# Altium footprint library NASCO 3D PCBLIB.PcbLib: 108 footprints (part 2 of 7)
Each footprint in its own frame and in the unit in brackets; x right, y up, seen from the top. Pads: shape width x height; smd on the part's side, far side on the other; paste and mask are expansions set on the pad; w line width, h text height; cw(c..) or ccw(c..) is an arc to the next point about the centre after c.
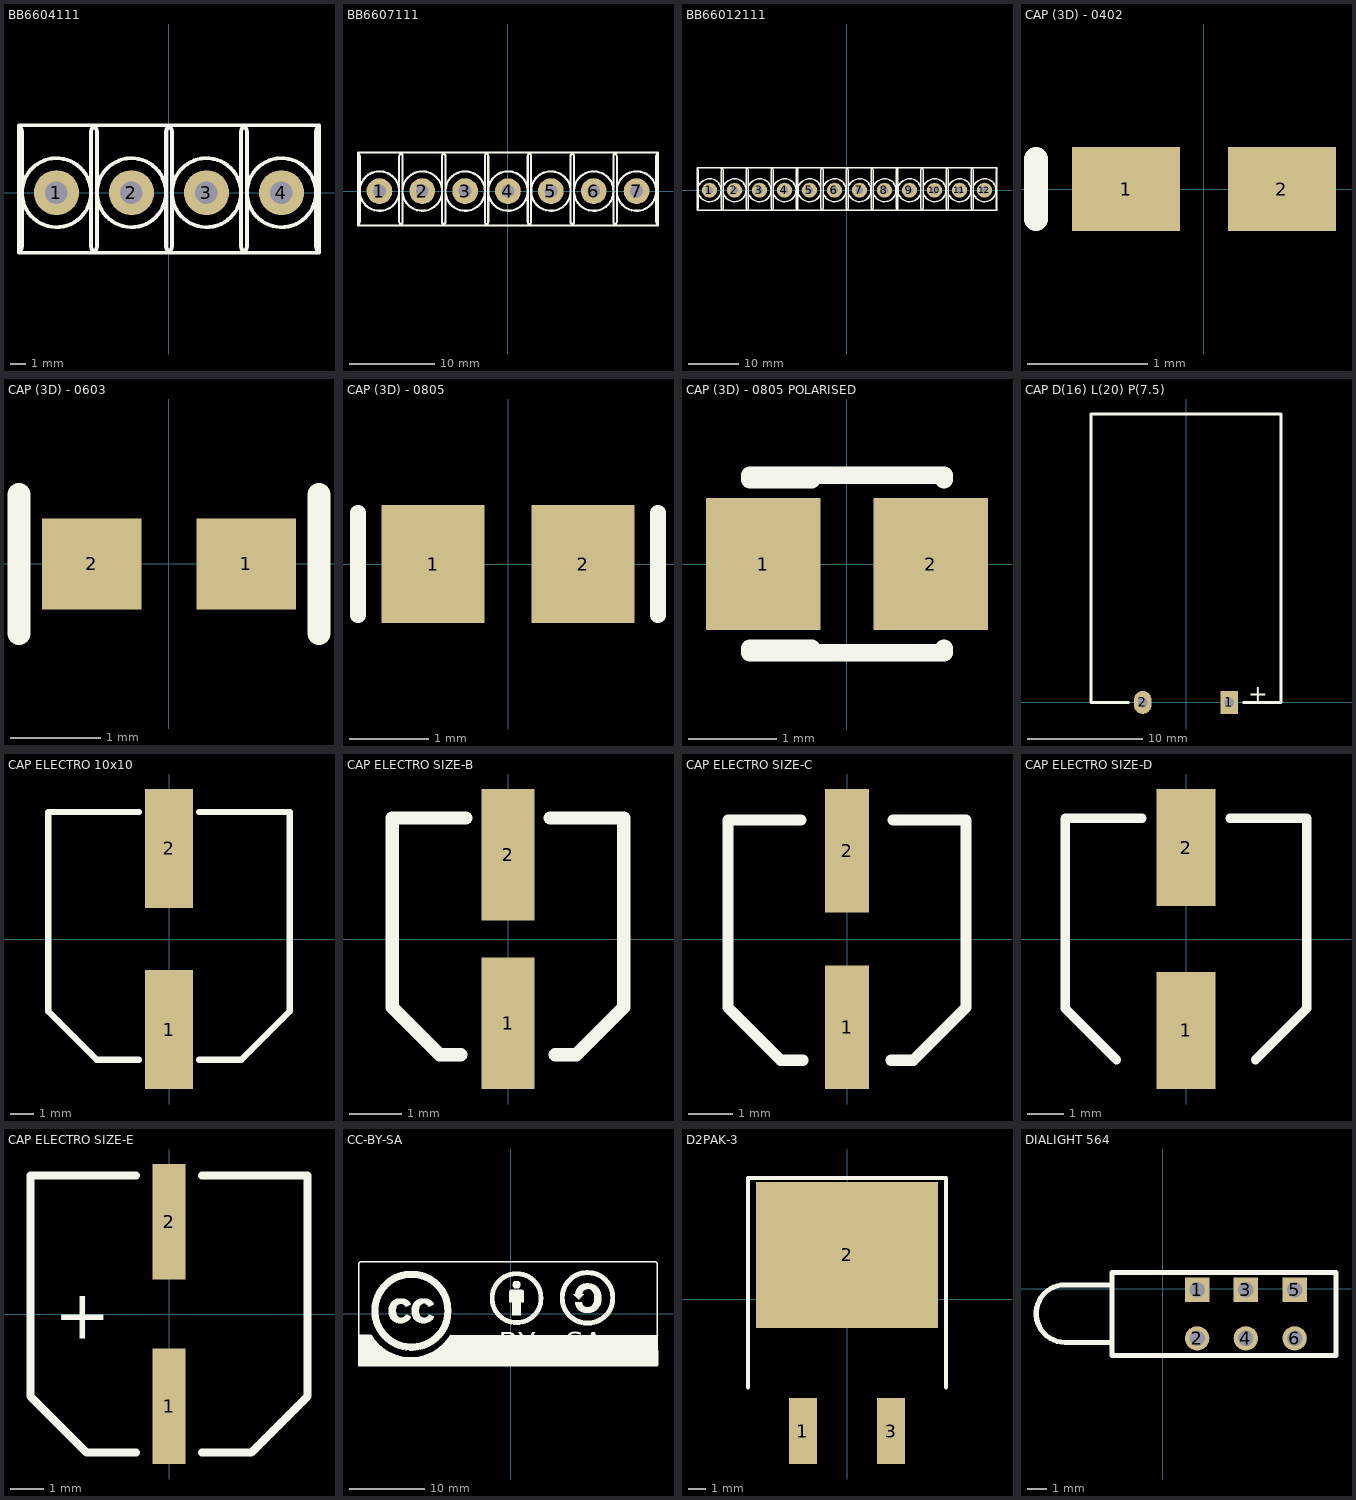
[diagram p1: the footprints below, top view; thin cyan lines are the x and y axes]

## BB6604111 [mm] "RAILTEC B 4 WAY"
pads (4):
  round 3 hole 1.5: 1(-7.5,0) 2(-2.5,0) 3(2.5,0) 4(7.5,0)
Top Overlay:
  circle w0.254: c-7.5,0 r2.3
  circle w0.254: c-2.5,0 r2.3
  circle w0.254: c2.5,0 r2.3
  circle w0.254: c7.5,0 r2.3
  lines w0.254: -9.827,-3.704 -10,-4.004 ; -9.827,4.196 -10,4.496 ; -9.8,-3.604 -9.8,4.096 ; -5.2,-3.604 -5.2,4.096 ; -5.173,-3.704 -5,-4.004 -4.827,-3.704 ; -5.173,4.196 -5,4.496 -4.827,4.196 ; -4.8,-3.604 -4.8,4.096 ; -0.2,-3.604 -0.2,4.096 ; -0.173,-3.704 0,-4.004 ; -0.173,4.196 0,4.496 ; 0.173,-3.704 0,-4.004 ; 0.173,4.196 0,4.496 ; 0.2,-3.604 0.2,4.096 ; 4.8,-3.604 4.8,4.096 ; 4.827,-3.704 5,-4.004 5.173,-3.704 ; 4.827,4.196 5,4.496 5.173,4.196 ; 5.2,-3.604 5.2,4.096 ; 9.8,-3.604 9.8,4.096 ; 9.827,-3.704 10,-4.004 ; 9.827,4.196 10,4.496 ; -10,-4.004 0,-4.004 ; -10,-4.004 -10,4.496 ; -10,-4.004 -10,4.496 ; -10,4.496 0,4.496 ; 0,-4.004 10,-4.004 ; 0,4.496 10,4.496 ; 10,-4.004 10,4.496 ; 10,4.496 10,4.496 ; 10,4.496 10,4.496
3D body "terminal_blocks_a-tb500-tk04sb.stp": height 14.02, standoff -4.68, extent -10,-3.809 10,4.496

## BB6607111 [mm] "RAILTEC B 7 WAY"
pads (7):
  round 3 hole 1.5: 1(-15,0) 2(-10,0) 3(-5,0) 4(0,0) 5(5,0) 6(10,0) 7(15,0)
Top Overlay:
  circle w0.254: c0,0 r2.3
  circle w0.254: c5,0 r2.3
  circle w0.254: c10,0 r2.3
  circle w0.254: c15,0 r2.3
  circle w0.254: c-15,0 r2.3
  circle w0.254: c-10,0 r2.3
  circle w0.254: c-5,0 r2.3
  circle w0.254: c0,0 r2.3
  lines w0.254: -17.327,-3.704 -17.5,-4.004 ; -17.327,4.196 -17.5,4.496 ; -17.3,-3.604 -17.3,4.096 ; -12.7,-3.604 -12.7,4.096 ; -12.673,-3.704 -12.5,-4.004 -12.327,-3.704 ; -12.673,4.196 -12.5,4.496 -12.327,4.196 ; -12.3,-3.604 -12.3,4.096 ; -7.7,-3.604 -7.7,4.096 ; -7.673,-3.704 -7.5,-4.004 ; -7.673,4.196 -7.5,4.496 ; -7.327,-3.704 -7.5,-4.004 ; -7.327,4.196 -7.5,4.496 ; -7.3,-3.604 -7.3,4.096 ; -2.7,-3.604 -2.7,4.096 ; -2.673,-3.704 -2.5,-4.004 ; -2.673,4.196 -2.5,4.496 ; 2.673,-3.704 2.5,-4.004 ; 2.673,4.196 2.5,4.496 ; 2.7,-3.604 2.7,4.096 ; 7.3,-3.604 7.3,4.096 ; 7.327,-3.704 7.5,-4.004 ; 7.327,4.196 7.5,4.496 ; 7.673,-3.704 7.5,-4.004 ; 7.673,4.196 7.5,4.496 ; 7.7,-3.604 7.7,4.096 ; 12.3,-3.604 12.3,4.096 ; 12.327,-3.704 12.5,-4.004 12.673,-3.704 ; 12.327,4.196 12.5,4.496 12.673,4.196 ; 12.7,-3.604 12.7,4.096 ; 17.3,-3.604 17.3,4.096 ; 17.327,-3.704 17.5,-4.004 ; 17.327,4.196 17.5,4.496 ; -17.5,-4.004 -7.5,-4.004 ; -17.5,-4.004 -17.5,4.496 ; -17.5,-4.004 -17.5,4.496 ; -17.5,4.496 -7.5,4.496 ; -7.5,-4.004 2.5,-4.004 ; -7.5,4.496 2.5,4.496 ; -2.5,-4.004 -2.327,-3.704 -2.5,-4.004 ; -2.5,-4.004 7.5,-4.004 ; -2.5,4.496 -2.327,4.196 -2.5,4.496 ; -2.5,4.496 7.5,4.496 ; 2.5,-4.004 2.327,-3.704 2.5,-4.004 ; 2.5,4.496 2.327,4.196 2.5,4.496 ; 2.5,4.496 2.5,4.496 ; 2.5,4.496 2.5,4.496 ; 7.5,-4.004 17.5,-4.004 ; 7.5,4.496 17.5,4.496 ; 17.5,-4.004 17.5,4.496 ; 17.5,4.496 17.5,4.496 ; 17.5,4.496 17.5,4.496 ; -2.3,-3.604 -2.3,4.096 -2.3,-3.604 ; 2.3,-3.604 2.3,4.096 2.3,-3.604
3D body "terminal_blocks_a-tb500-tk04sb.stp": height 14.02, standoff -4.68, extent -2.5,-3.809 17.5,4.496
3D body "terminal_blocks_a-tb500-tk04sb.stp": height 14.02, standoff -4.68, extent -17.5,-3.809 2.5,4.496

## BB66012111 [mm] "RAILTEC B 12 WAY"
pads (12):
  round 3 hole 1.5: 1(-27.5,0) 2(-22.5,0) 3(-17.5,0) 4(-12.5,0) 5(-7.5,0) 6(-2.5,0) 7(2.5,0) 8(7.5,0) 9(12.5,0) 10(17.5,0) 11(22.5,0) 12(27.5,0)
Top Overlay:
  circle w0.254: c-12.5,0 r2.3
  circle w0.254: c-17.5,0 r2.3
  circle w0.254: c-22.5,0 r2.3
  circle w0.254: c-27.5,0 r2.3
  circle w0.254: c7.5,0 r2.3
  circle w0.254: c2.5,0 r2.3
  circle w0.254: c-2.5,0 r2.3
  circle w0.254: c-7.5,0 r2.3
  circle w0.254: c27.5,0 r2.3
  circle w0.254: c22.5,0 r2.3
  circle w0.254: c17.5,0 r2.3
  circle w0.254: c12.5,0 r2.3
  lines w0.254: -29.827,-3.704 -30,-4.004 ; -29.827,4.196 -30,4.496 ; -29.8,-3.604 -29.8,4.096 ; -25.2,-3.604 -25.2,4.096 ; -25.173,-3.704 -25,-4.004 -24.827,-3.704 ; -25.173,4.196 -25,4.496 -24.827,4.196 ; -24.8,-3.604 -24.8,4.096 ; -20.2,-3.604 -20.2,4.096 ; -20.173,-3.704 -20,-4.004 ; -20.173,4.196 -20,4.496 ; -19.827,-3.704 -20,-4.004 ; -19.827,4.196 -20,4.496 ; -19.8,-3.604 -19.8,4.096 ; -15.2,-3.604 -15.2,4.096 ; -15.173,-3.704 -15,-4.004 -14.827,-3.704 ; -15.173,4.196 -15,4.496 -14.827,4.196 ; -14.8,-3.604 -14.8,4.096 ; -10.2,-3.604 -10.2,4.096 ; -10.173,-3.704 -10,-4.004 ; -10.173,4.196 -10,4.496 ; -9.827,-3.704 -10,-4.004 ; -9.827,4.196 -10,4.496 ; -9.8,-3.604 -9.8,4.096 ; -5.2,-3.604 -5.2,4.096 ; -5.173,-3.704 -5,-4.004 -4.827,-3.704 ; -5.173,4.196 -5,4.496 -4.827,4.196 ; -4.8,-3.604 -4.8,4.096 ; -0.2,-3.604 -0.2,4.096 ; -0.173,-3.704 0,-4.004 ; -0.173,4.196 0,4.496 ; 0.173,-3.704 0,-4.004 ; 0.173,4.196 0,4.496 ; 0.2,-3.604 0.2,4.096 ; 4.8,-3.604 4.8,4.096 ; 4.827,-3.704 5,-4.004 5.173,-3.704 ; 4.827,4.196 5,4.496 5.173,4.196 ; 5.2,-3.604 5.2,4.096 ; 9.8,-3.604 9.8,4.096 ; 9.827,-3.704 10,-4.004 ; 9.827,4.196 10,4.496 ; 10.173,-3.704 10,-4.004 ; 10.173,4.196 10,4.496 ; 10.2,-3.604 10.2,4.096 ; 14.8,-3.604 14.8,4.096 ; 14.827,-3.704 15,-4.004 15.173,-3.704 ; 14.827,4.196 15,4.496 15.173,4.196 ; 15.2,-3.604 15.2,4.096 ; 19.8,-3.604 19.8,4.096 ; 19.827,-3.704 20,-4.004 ; 19.827,4.196 20,4.496 ; 20.173,-3.704 20,-4.004 ; 20.173,4.196 20,4.496 ; 20.2,-3.604 20.2,4.096 ; 24.8,-3.604 24.8,4.096 ; 24.827,-3.704 25,-4.004 25.173,-3.704 ; 24.827,4.196 25,4.496 25.173,4.196 ; 25.2,-3.604 25.2,4.096 ; 29.8,-3.604 29.8,4.096 ; 29.827,-3.704 30,-4.004 ; 29.827,4.196 30,4.496 ; -30,-4.004 -30,4.496 ; -30,-4.004 -30,4.496 ; -30,-4.004 -20,-4.004 ; -30,4.496 -20,4.496 ; -20,-4.004 -10,-4.004 ; -20,4.496 -10,4.496 ; -10,-4.004 0,-4.004 ; -10,4.496 -10,4.496 ; -10,4.496 -10,4.496 ; -10,4.496 0,4.496 ; 0,-4.004 10,-4.004 ; 0,4.496 10,4.496 ; 10,-4.004 20,-4.004 ; 10,4.496 10,4.496 ; 10,4.496 10,4.496 ; 10,4.496 20,4.496 ; 20,-4.004 30,-4.004 ; 20,4.496 30,4.496 ; 30,-4.004 30,4.496 ; 30,4.496 30,4.496 ; 30,4.496 30,4.496
3D body "terminal_blocks_a-tb500-tk04sb.stp": height 14.02, standoff -4.68, extent -30,-3.809 -10,4.496
3D body "terminal_blocks_a-tb500-tk04sb.stp": height 14.02, standoff -4.68, extent -10,-3.809 10,4.496
3D body "terminal_blocks_a-tb500-tk04sb.stp": height 14.02, standoff -4.68, extent 10,-3.809 30,4.496

## CAP (3D) - 0402 [mm] "Chip Capacitor; Body 1.0 x 0.5 mm (LxW typ)"
height 0.55
pads (2):
  rect 0.9x0.7 smd: 1(-0.65,0) 2(0.65,0)
Top Overlay:
  lines w0.2: -1.4,-0.25 -1.4,0.25
3D body: height 0.5, standoff 0, extent -0.675,-0.25 -0.375,0.25
3D body: height 0.5, standoff 0, extent 0.375,-0.25 0.675,0.25
3D body: height 0.5, standoff 0, extent -0.375,-0.25 0.375,0.25

## CAP (3D) - 0603 [mm]
height 0.025
pads (2):
  rect 1.1x1 smd: 1(0.85,0) 2(-0.85,0)
Top Overlay:
  lines w0.254: -1.651,-0.762 -1.651,0.762 ; 1.651,-0.762 1.651,0.762
3D body: height 0.92, standoff 0, extent -0.5,-0.4 0.5,0.4
3D body: height 0.92, standoff 0, extent 0.5,-0.4 0.8,0.4
3D body: height 0.92, standoff 0, extent -0.8,-0.4 -0.5,0.4

## CAP (3D) - 0805 [mm]
height 1.2
pads (2):
  rect 1.3x1.5 smd: 1(-0.95,0) 2(0.95,0)
Top Overlay:
  lines w0.2: -1.9,-0.65 -1.9,0.65 ; 1.9,-0.65 1.9,0.65
3D body: height 1, standoff 0, extent -1,-0.625 -0.5,0.625
3D body: height 1, standoff 0, extent -0.5,-0.625 0.5,0.625
3D body: height 1, standoff 0, extent 0.5,-0.625 1,0.625

## CAP (3D) - 0805 POLARISED [mm]
height 1.2
pads (2):
  rect 1.3x1.5 smd: 1(-0.95,0) 2(0.95,0)
Top Overlay:
  lines w0.2: -1.1,-1.004 1.1,-1.004 1.1,-0.954 ; -1.1,-0.954 -0.4,-0.954 ; -1.1,0.954 -0.4,0.954 ; -1.1,1.004 1.1,1.004 1.1,0.954
3D body: height 1, standoff 0, extent 0.5,-0.625 1,0.625
3D body: height 1, standoff 0, extent -0.5,-0.625 0.5,0.625
3D body: height 1, standoff 0, extent -1,-0.625 -0.5,0.625

## CAP D(16) L(20) P(7.5) [mm] "Polarized Capacitor (Radial); 2 Leads"
pads (2):
  rect 1.5x2 hole 0.85: 1(3.75,0)
  oval 1.5x2 hole 0.85: 2(-3.75,0)
Top Overlay:
  lines w0.254: -5,0 -8.25,0 -8.25,25 8.25,25 8.25,0 5,0
  text "+" at 5.382,0.013 h1.5
3D body "User Library-CapAluRadial_D160H200.STEP": height 16.22, standoff -0.22, extent -8.215,0 8.215,25

## CAP ELECTRO 10x10 [mm]
pads (2):
  rect 2x5 smd: 1(0,-3.81) 2(0,3.81)
Top Overlay:
  lines w0.254: -1.27,-5.08 -3.048,-5.08 -5.08,-3.048 -5.08,5.334 -1.27,5.334 ; 1.27,-5.08 3.048,-5.08 5.08,-3.048 5.08,5.334 1.27,5.334
3D body "User Library-10x10,5f.step": height 10.61, standoff -0.01, extent -5.113,-5.453 5.187,5.847

## CAP ELECTRO SIZE-B [mm]
pads (2):
  rect 1x2.5 smd: 1(0,-1.6) 2(0,1.6)
Top Overlay:
  lines w0.254: -0.9,-2.2 -1.3,-2.2 -2.2,-1.3 -2.2,2.3 -0.8,2.3 ; 0.8,2.3 2.2,2.3 2.2,-1.3 1.3,-2.2 0.9,-2.2
3D body "User Library-ALU-B.STEP": height 5.4, standoff 0, extent -2.15,-2.3 2.15,2.3

## CAP ELECTRO SIZE-C [mm]
pads (2):
  rect 1x2.8 smd: 1(0,-2) 2(0,2)
Top Overlay:
  lines w0.254: -1.05,2.7 -2.7,2.7 -2.7,0 -2.7,-1.55 -1.5,-2.75 -1,-2.75 ; 1,-2.75 1.5,-2.75 2.7,-1.55 2.7,0 ; 2.7,0 2.7,2.7 ; 2.7,0 2.7,2.7 ; 2.7,2.7 1.05,2.7 2.7,2.7
3D body "User Library-ALU-C.STEP": height 5.41, standoff 0, extent -2.65,-2.95 2.65,2.95

## CAP ELECTRO SIZE-D [mm]
pads (2):
  rect 1.6x3.2 smd: 1(0,-2.5) 2(0,2.5)
Top Overlay:
  lines w0.254: -1.9,-3.3 -3.3,-1.9 -3.3,3.3 -1.2,3.3 ; 1.2,3.3 3.3,3.3 3.3,-1.9 1.9,-3.3
3D body "User Library-ALU-D.STEP": height 5.4, standoff 0, extent -3.3,-3.5 3.3,3.5

## CAP ELECTRO SIZE-E [mm]
pads (2):
  rect 1x3.5 smd: 1(0,-2.8) 2(0,2.8)
Top Overlay:
  lines w0.254: -1,-4.2 -2.5,-4.2 -4.2,-2.5 -4.2,0 -4.2,4.2 -1,4.2 ; 1,-4.2 2.5,-4.2 4.2,-2.5 4.2,0 4.2,4.2 1,4.2
  text "+" at -3.475,-0.75 h1.5
3D body "User Library-ALU-E.STEP": height 6.2, standoff 0, extent -4.15,-4.5 4.15,4.5

## CC-BY-SA [mm] "Creative Commons Logo"
Top Overlay:
  drawing of 27 lines, arcs and shapes, not listed
  text "BY" at -1.612,-6.209 h4.77
  text "SA" at 7.381,-6.209 h4.77

## D2PAK-3 [mm] "ONSEMI MC7805BDTRKG"
pads (3):
  rect 1.6x3.8 smd: 1(-2.54,-7.62) 3(2.54,-7.62)
  rect 10.5x8.4 smd: 2(0,2.54)
Top Overlay:
  lines w0.254: -5.715,-5.08 -5.715,6.985 5.715,6.985 5.715,-5.08
3D body: height 2, standoff 0, extent 2.032,-8.636 3.048,-4.572
3D body: height 2, standoff 0, extent -3.048,-8.636 -2.032,-4.572
3D body: height 2.4, standoff 0, extent -5.08,-4.572 5.08,5.588

## DIALIGHT 564 [mil] "3mm triple INDICATOR"
pads (6):
  rect 50x50 hole 32: 1(71,-2) 3(171,-2) 5(271,-2)
  round 50 hole 32: 2(71,-102) 4(171,-102) 6(271,-102)
Top Overlay:
  lines w10: -110,-110 -200,-110 cw(c-200,-50.94) -200,8.11 -110,8.11 ; -104.84,7.84 -200.69,7.84 ccw(c-200.69,-51.21) -200.69,-110.27 -104.27,-110.27 ; 281,-137 356,-137 356,33 311,33 -104,33 -104,-52 -104,-137 311,-137
3D body: height 600, standoff 0, extent -104,-137 356,33
3D body: height 559.05, standoff 440.94, extent -262.49,-108.8 -145,8.8
3D body: height 359.06, standoff 240.94, extent -262.49,-108.8 -145,8.8
3D body: height 159.06, standoff 40.94, extent -262.61,-108.75 -145,8.75
3D body: height 158.59, standoff 40.94, extent -200,-108.94 -110,8.94
3D body: height 358.59, standoff 240.94, extent -200,-108.94 -110,8.94
3D body: height 558.59, standoff 440.94, extent -200,-108.94 -110,8.94